# Altium footprint library Connector_art.PcbLib: 209 footprints (part 3 of 14)
Each footprint in its own frame and in the unit in brackets; x right, y up, seen from the top. Pads: shape width x height; smd on the part's side, far side on the other; paste and mask are expansions set on the pad; w line width, h text height; cw(c..) or ccw(c..) is an arc to the next point about the centre after c.
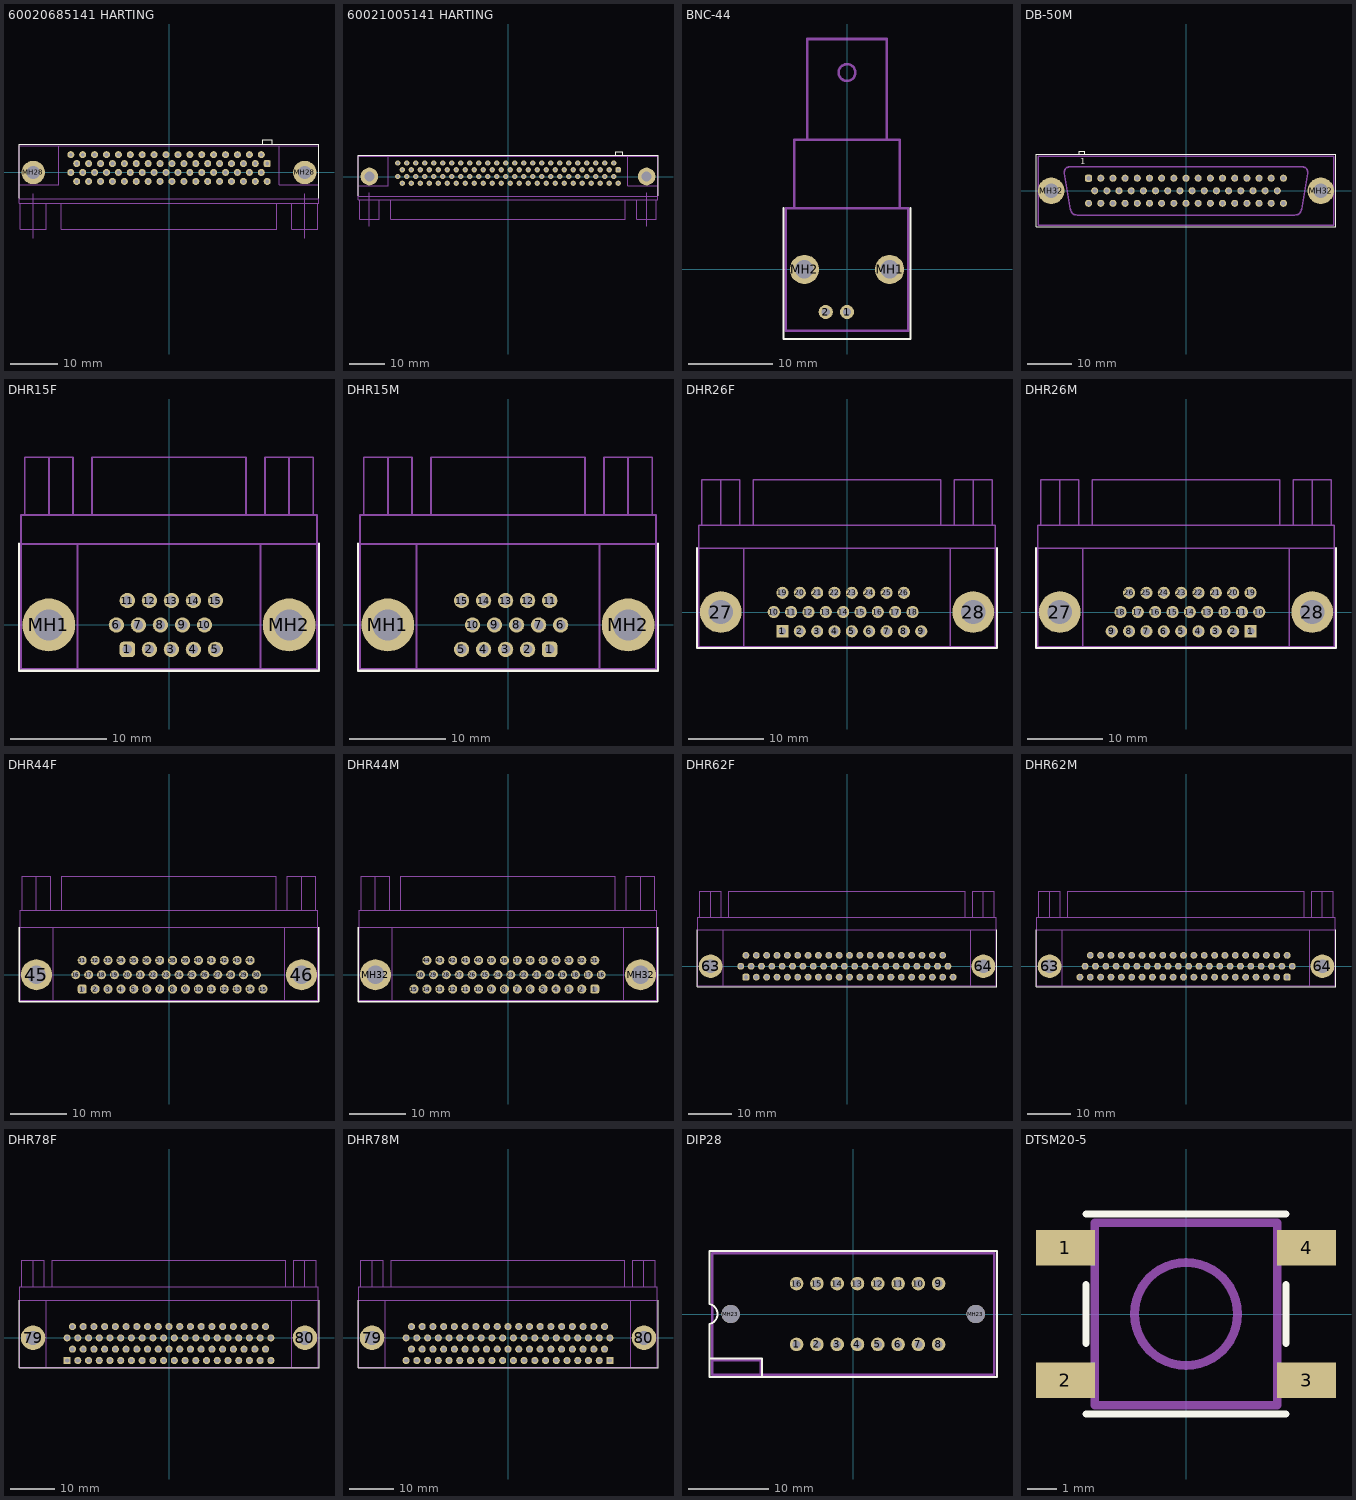
[diagram p2: the footprints below, top view; thin cyan lines are the x and y axes]

## 60020685141 HARTING [mm]
pads (70):
  rrect50% 1.5x1.5 hole 0.8: 1(20.955,1.9)
  round 1.5 hole 0.8: 2(19.685,3.8) 3(18.415,1.9) 4(17.145,3.8) 5(15.875,1.9) 6(14.605,3.8) 7(13.335,1.9) 8(12.065,3.8) 9(10.795,1.9) 10(9.525,3.8) 11(8.255,1.9) 12(6.985,3.8) 13(5.715,1.9) 14(4.445,3.8) 15(3.175,1.9) 16(1.905,3.8) 17(0.635,1.9) 18(-0.635,3.8) 19(-1.905,1.9) 20(-3.175,3.8) 21(-4.445,1.9) 22(-5.715,3.8) 23(-6.985,1.9) 24(-8.255,3.8) 25(-9.525,1.9) 26(-10.795,3.8) 27(-12.065,1.9) 28(-13.335,3.8) 29(-14.605,1.9) 30(-15.875,3.8) 31(-17.145,1.9) 32(-18.415,3.8) 33(-19.685,1.9) 34(-20.955,3.8) 35(20.955,-1.9) 36(19.685,0) 37(18.415,-1.9) 38(17.145,0) 39(15.875,-1.9) 40(14.605,0) 41(13.335,-1.9) 42(12.065,0) 43(10.795,-1.9) 44(9.525,0) 45(8.255,-1.9) 46(6.985,0) 47(5.715,-1.9) 48(4.445,0) 49(3.175,-1.9) 50(1.905,0) 51(0.635,-1.9) 52(-0.635,0) 53(-1.905,-1.9) 54(-3.175,0) 55(-4.445,-1.9) 56(-5.715,0) 57(-6.985,-1.9) 58(-8.255,0) 59(-9.525,-1.9) 60(-10.795,0) 61(-12.065,-1.9) 62(-13.335,0) 63(-14.605,-1.9) 64(-15.875,0) 65(-17.145,-1.9) 66(-18.415,0) 67(-19.685,-1.9) 68(-20.955,0)
  round 5 hole 2.8: MH28(-28.95,0) MH28(28.95,0)
Top Overlay:
  lines w0.25: -32,-5.5 -32,6 32,6 32,-5.5 ; 20,6 20,7 22,7 22,6
Mechanical 1:
  lines w0.1: -28.95,-14.05 -28.95,-4.55 ; 28.95,-14.05 28.95,-4.55
  lines w0.2: -31.9,-5.6 31.9,-5.6 ; -31.9,-2.6 -23.5,-2.6 -23.5,5.7 ; -31.7,-6.6 -31.7,-12.1 -26.2,-12.1 -26.2,-6.6 ; -23,-6.6 -23,-12.1 23,-12.1 23,-6.6 ; 23.5,5.7 23.5,-2.6 31.9,-2.6 ; 26.2,-6.6 26.2,-12.1 31.7,-12.1 31.7,-6.6 ; -31.9,-6.6 -31.9,5.7 31.9,5.7 31.9,-6.6 -31.9,-6.6
3D body: height 9.62, standoff -3.4, extent -31.94,-12.11 31.94,5.69

## 60021005141 HARTING [mm] "Female"
height 8.7
pads (102):
  rrect50% 1.5x1.5 hole 0.8: 1(31.115,1.9)
  round 1.5 hole 0.8: 2(29.845,3.8) 3(28.575,1.9) 4(27.305,3.8) 5(26.035,1.9) 6(24.765,3.8) 7(23.495,1.9) 8(22.225,3.8) 9(20.955,1.9) 10(19.685,3.8) 11(18.415,1.9) 12(17.145,3.8) 13(15.875,1.9) 14(14.605,3.8) 15(13.335,1.9) 16(12.065,3.8) 17(10.795,1.9) 18(9.525,3.8) 19(8.255,1.9) 20(6.985,3.8) 21(5.715,1.9) 22(4.445,3.8) 23(3.175,1.9) 24(1.905,3.8) 25(0.635,1.9) 26(-0.635,3.8) 27(-1.905,1.9) 28(-3.175,3.8) 29(-4.445,1.9) 30(-5.715,3.8) 31(-6.985,1.9) 32(-8.255,3.8) 33(-9.525,1.9) 34(-10.795,3.8) 35(-12.065,1.9) 36(-13.335,3.8) 37(-14.605,1.9) 38(-15.875,3.8) 39(-17.145,1.9) 40(-18.415,3.8) 41(-19.685,1.9) 42(-20.955,3.8) 43(-22.225,1.9) 44(-23.495,3.8) 45(-24.765,1.9) 46(-26.035,3.8) 47(-27.305,1.9) 48(-28.575,3.8) 49(-29.845,1.9) 50(-31.115,3.8) 51(31.115,-1.9) 52(29.845,0) 53(28.575,-1.9) 54(27.305,0) 55(26.035,-1.9) 56(24.765,0) 57(23.495,-1.9) 58(22.225,0) 59(20.955,-1.9) 60(19.685,0) 61(18.415,-1.9) 62(17.145,0) 63(15.875,-1.9) 64(14.605,0) 65(13.335,-1.9) 66(12.065,0) 67(10.795,-1.9) 68(9.525,0) 69(8.255,-1.9) 70(6.985,0) 71(5.715,-1.9) 72(4.445,0) 73(3.175,-1.9) 74(1.905,0) 75(0.635,-1.9) 76(-0.635,0) 77(-1.905,-1.9) 78(-3.175,0) 79(-4.445,-1.9) 80(-5.715,0) 81(-6.985,-1.9) 82(-8.255,0) 83(-9.525,-1.9) 84(-10.795,0) 85(-12.065,-1.9) 86(-13.335,0) 87(-14.605,-1.9) 88(-15.875,0) 89(-17.145,-1.9) 90(-18.415,0) 91(-19.685,-1.9) 92(-20.955,0) 93(-22.225,-1.9) 94(-23.495,0) 95(-24.765,-1.9) 96(-26.035,0) 97(-27.305,-1.9) 98(-28.575,0) 99(-29.845,-1.9) 100(-31.115,0)
  round 5 hole 2.8: MH28(-39.15,0) MH28(39.15,0)
Top Overlay:
  lines w0.25: -42.35,-5.5 -42.35,6 42.35,6 42.35,-5.5 ; 30.4,6 30.4,7 32.4,7 32.4,6
Mechanical 1:
  lines w0.1: -39.15,-14.05 -39.15,-4.55 ; 39.15,-14.05 39.15,-4.55
  lines w0.2: -42.25,-5.6 42.25,-5.6 ; -42.25,-2.6 -33.85,-2.6 -33.85,5.7 ; -41.9,-6.6 -41.9,-12.1 -36.4,-12.1 -36.4,-6.6 ; -33.1,-6.6 -33.1,-12.1 33.1,-12.1 33.1,-6.6 ; 33.85,5.7 33.85,-2.6 42.25,-2.6 ; 36.4,-6.6 36.4,-12.1 41.9,-12.1 41.9,-6.6 ; -42.25,-6.6 -42.25,5.7 42.25,5.7 42.25,-6.6 -42.25,-6.6
3D body: height 9.62, standoff -3.4, extent -42.1,-12.11 42.1,5.69

## BNC-44 [mm]
height 13.16
pads (4):
  round 1.7 hole 1: 1(0,-5.08) 2(-2.54,-5.08)
  round 3.5 hole 2.2: MH1(5.08,0) MH2(-5.08,0)
Top Overlay:
  lines w0.25: -7.6,7.3 -7.6,-8.3 7.6,-8.3 7.6,7.3
Mechanical 1:
  circle w0.3: c0,23.5 r1
  lines w0.3: -6.3,7.3 -6.3,15.5 6.3,15.5 6.3,7.3 ; -4.75,15.5 -4.75,27.5 4.75,27.5 4.75,15.5 ; -7.3,-7.3 7.3,-7.3 7.3,7.3 -7.3,7.3 -7.3,-7.3
3D body: height 13.16, standoff -3.7, extent -7.35,-8.1 7.35,27.5

## DB-50M [mm]
pads (52):
  rrect50% 1.6x1.6 hole 1: 1(-22.08,2.84)
  round 1.6 hole 1: 2(-19.32,2.84) 3(-16.56,2.84) 4(-13.8,2.84) 5(-11.04,2.84) 6(-8.28,2.84) 7(-5.52,2.84) 8(-2.76,2.84) 9(0,2.84) 10(2.76,2.84) 11(5.52,2.84) 12(8.28,2.84) 13(11.04,2.84) 14(13.8,2.84) 15(16.56,2.84) 16(19.32,2.84) 17(22.08,2.84) 18(-20.7,0) 19(-17.94,0) 20(-15.18,0) 21(-12.42,0) 22(-9.66,0) 23(-6.9,0) 24(-4.14,0) 25(-1.38,0) 26(1.38,0) 27(4.14,0) 28(6.9,0) 29(9.66,0) 30(12.42,0) 31(15.18,0) 32(17.94,0) 33(20.7,0) 34(-22.08,-2.84) 35(-19.32,-2.84) 36(-16.56,-2.84) 37(-13.8,-2.84) 38(-11.04,-2.84) 39(-8.28,-2.84) 40(-5.52,-2.84) 41(-2.76,-2.84) 42(0,-2.84) 43(2.76,-2.84) 44(5.52,-2.84) 45(8.28,-2.84) 46(11.04,-2.84) 47(13.8,-2.84) 48(16.56,-2.84) 49(19.32,-2.84) 50(22.08,-2.84)
  round 6 hole 3.2: MH32(-30.55,0) MH32(30.55,0)
Top Overlay:
  lines w0.25: -24.25,8.3 -24.25,9 -23,9 -23,8.3 ; -34,-8.2 34,-8.2 34,8.3 -34,8.3 -34,-8.2
  text "1" at -24,6 h1.38
Mechanical 1:
  circle w0.3: c-22.08,-2.84 r0.5
  circle w0.3: c-22.08,2.84 r0.5
  circle w0.3: c-19.32,-2.84 r0.5
  circle w0.3: c-19.32,2.84 r0.5
  circle w0.3: c-16.56,-2.84 r0.5
  circle w0.3: c-16.56,2.84 r0.5
  circle w0.3: c-13.8,-2.84 r0.5
  circle w0.3: c-13.8,2.84 r0.5
  circle w0.3: c-11.04,-2.84 r0.5
  circle w0.3: c-11.04,2.84 r0.5
  circle w0.3: c-8.28,-2.84 r0.5
  circle w0.3: c-8.28,2.84 r0.5
  circle w0.3: c-5.52,-2.84 r0.5
  circle w0.3: c-5.52,2.84 r0.5
  circle w0.3: c-2.76,-2.84 r0.5
  circle w0.3: c-2.76,2.84 r0.5
  circle w0.3: c22.08,-2.84 r0.5
  circle w0.3: c22.08,2.84 r0.5
  circle w0.3: c19.32,-2.84 r0.5
  circle w0.3: c19.32,2.84 r0.5
  circle w0.3: c16.56,-2.84 r0.5
  circle w0.3: c16.56,2.84 r0.5
  circle w0.3: c13.8,-2.84 r0.5
  circle w0.3: c13.8,2.84 r0.5
  circle w0.3: c11.04,-2.84 r0.5
  circle w0.3: c11.04,2.84 r0.5
  circle w0.3: c8.28,-2.84 r0.5
  circle w0.3: c8.28,2.84 r0.5
  circle w0.3: c5.52,-2.84 r0.5
  circle w0.3: c5.52,2.84 r0.5
  circle w0.3: c2.76,-2.84 r0.5
  circle w0.3: c2.76,2.84 r0.5
  circle w0.3: c-20.7,0 r0.5
  circle w0.3: c-17.94,0 r0.5
  circle w0.3: c-15.18,0 r0.5
  circle w0.3: c-12.42,0 r0.5
  circle w0.3: c-9.66,0 r0.5
  circle w0.3: c-6.9,0 r0.5
  circle w0.3: c-4.14,0 r0.5
  circle w0.3: c20.7,0 r0.5
  circle w0.3: c17.94,0 r0.5
  circle w0.3: c15.18,0 r0.5
  circle w0.3: c12.42,0 r0.5
  circle w0.3: c9.66,0 r0.5
  circle w0.3: c6.9,0 r0.5
  circle w0.3: c4.14,0 r0.5
  circle w0.3: c0,2.84 r0.5
  circle w0.3: c1.38,0 r0.5
  circle w0.3: c-1.38,0 r0.5
  circle w0.3: c0,-2.84 r0.5
  circle w0.3: c-30.55,0 r1.5
  circle w0.3: c30.55,0 r1.5
  lines w0.1: -33.05,0 -28.05,0 ; -30.55,-2.5 -30.55,2.5 ; 28.05,0 33.05,0 ; 30.55,-2.5 30.55,2.5
  lines w0.3: -26.2,-4.2 -27.65,4 cw(c-26.15,4) -26.15,5.5 ; -26.2,5.5 26.2,5.5 ; -26.193,-4.149 ccw(c-24.7,-4) -24.7,-5.5 24.7,-5.5 ccw(c24.7,-4) 26.193,-4.149 ; 26.15,5.5 cw(c26.15,4) 27.65,4 26.2,-4.2 ; -33.5,-7.8 33.5,-7.8 33.5,7.8 -33.5,7.8 -33.5,-7.8
  text "18" at -23.89,-0.5 h2.12
  text "33" at 22.36,-0.75 h2.12
  text "34" at -25.39,-3.5 h2.12
  text "50" at 23.86,-3.5 h2.12
  text "1" at -25.39,2.25 h2.12
  text "17" at 23.61,2.25 h2.12

## DHR15F [mm]
pads (17):
  rrect50% 1.6x1.6 hole 1: 1(-4.33,-2.54)
  round 1.6 hole 1: 2(-2.04,-2.54) 3(0.25,-2.54) 4(2.54,-2.54) 5(4.83,-2.54) 6(-5.47,0) 7(-3.18,0) 8(-0.89,0) 9(1.4,0) 10(3.69,0) 11(-4.33,2.54) 12(-2.04,2.54) 13(0.25,2.54) 14(2.54,2.54) 15(4.83,2.54)
  round 5.5 hole 3.2: MH1(-12.5,0) MH2(12.5,0)
Top Overlay:
  lines w0.25: -15.6,8.44 -15.6,-4.76 15.6,-4.76 15.6,-4.56 15.6,8.44
Mechanical 1:
  lines w0.2: -15.4,8.44 15.4,8.44 ; -15,11.44 -15,17.44 -10,17.44 -10,11.44 ; -12.5,11.44 -12.5,17.44 ; -9.5,-4.56 -9.5,8.44 ; -8,11.44 -8,17.44 8,17.44 8,11.44 ; 9.5,-4.56 9.5,8.44 ; 10,11.44 10,17.44 15,17.44 15,11.44 ; 12.5,11.44 12.5,17.44 ; -15.4,-4.56 -15.4,11.44 15.4,11.44 15.4,-4.56 -15.4,-4.56
  text "11" at -7.424,1.343 h2.12
  text "6" at -7.528,-1.157 h2.12
  text "10" at 5.076,-1.157 h2.12
  text "1" at -6.528,-3.657 h2.12
  text "15" at 6.076,1.343 h2.12
  text "5" at 6.472,-3.657 h2.12
3D body: height 12.55, standoff -3.8, extent -15.45,-3.97 15.45,17.63

## DHR15M [mm]
pads (17):
  rrect50% 1.6x1.6 hole 1: 1(4.33,-2.54)
  round 1.6 hole 1: 2(2.04,-2.54) 3(-0.25,-2.54) 4(-2.54,-2.54) 5(-4.83,-2.54) 6(5.47,0) 7(3.18,0) 8(0.89,0) 9(-1.4,0) 10(-3.69,0) 11(4.33,2.54) 12(2.04,2.54) 13(-0.25,2.54) 14(-2.54,2.54) 15(-4.83,2.54)
  round 5.5 hole 3.2: MH1(-12.5,0) MH2(12.5,0)
Top Overlay:
  lines w0.25: -15.6,8.44 -15.6,-4.76 15.6,-4.76 15.6,-4.56 15.6,8.44
Mechanical 1:
  lines w0.2: -15.4,8.44 15.4,8.44 ; -15,11.44 -15,17.44 -10,17.44 -10,11.44 ; -12.5,11.44 -12.5,17.44 ; -9.5,-4.56 -9.5,8.44 ; -8,11.44 -8,17.44 8,17.44 8,11.44 ; 9.5,-4.56 9.5,8.44 ; 10,11.44 10,17.44 15,17.44 15,11.44 ; 12.5,11.44 12.5,17.44 ; -15.4,-4.56 -15.4,11.44 15.4,11.44 15.4,-4.56 -15.4,-4.56
  text "11" at 5.226,1.283 h2.12
  text "1" at 5.622,-3.797 h2.12
  text "10" at -7.924,-1.157 h2.12
  text "15" at -8.744,1.283 h2.12
  text "6" at 6.892,-1.257 h2.12
  text "5" at -8.348,-3.797 h2.12
3D body: height 12.5, standoff -3.5, extent -15.405,-4.87 15.405,17.43

## DHR26F [mm]
pads (28):
  rect 1.6x1.6 hole 1: 1(-8.52,-2.54)
  round 1.6 hole 1: 2(-6.23,-2.54) 3(-3.94,-2.54) 4(-1.65,-2.54) 5(0.64,-2.54) 6(2.93,-2.54) 7(5.22,-2.54) 8(7.51,-2.54) 9(9.8,-2.54) 10(-9.67,0) 11(-7.38,0) 12(-5.09,0) 13(-2.8,0) 14(-0.51,0) 15(1.78,0) 16(4.07,0) 17(6.36,0) 18(8.65,0) 19(-8.52,2.54) 20(-6.23,2.54) 21(-3.94,2.54) 22(-1.65,2.54) 23(0.64,2.54) 24(2.93,2.54) 25(5.22,2.54) 26(7.51,2.54)
  round 5.5 hole 3.2: 27(-16.65,0) 28(16.65,0)
Top Overlay:
  lines w0.25: -19.8,8.44 -19.8,-4.76 19.8,-4.76 19.8,8.44
Mechanical 1:
  lines w0.2: -19.6,8.44 19.6,8.44 ; -19.15,11.44 -19.15,17.44 -14.15,17.44 -14.15,11.44 ; -16.65,11.44 -16.65,17.44 ; -13.65,-4.56 -13.65,8.44 ; -12.35,11.44 -12.35,17.44 12.35,17.44 12.35,11.44 ; 13.65,-4.56 13.65,8.44 ; 14.15,11.44 14.15,17.44 19.15,17.44 19.15,11.44 ; 16.65,11.44 16.65,17.44 ; -19.6,-4.56 19.6,-4.56 19.6,11.44 -19.6,11.44 -19.6,-4.56
  text "9" at 11.272,-3.717 h2.12
  text "1" at -11.728,-3.717 h2.12
  text "26" at 8.876,1.283 h2.12
  text "18" at 10.376,-1.217 h2.12
  text "19" at -12.124,1.283 h2.12
  text "10" at -13.124,-1.217 h2.12

## DHR26M [mm]
pads (28):
  rect 1.6x1.6 hole 1: 1(8.52,-2.54)
  round 1.6 hole 1: 2(6.23,-2.54) 3(3.94,-2.54) 4(1.65,-2.54) 5(-0.64,-2.54) 6(-2.93,-2.54) 7(-5.22,-2.54) 8(-7.51,-2.54) 9(-9.8,-2.54) 10(9.67,0) 11(7.38,0) 12(5.09,0) 13(2.8,0) 14(0.51,0) 15(-1.78,0) 16(-4.07,0) 17(-6.36,0) 18(-8.65,0) 19(8.52,2.54) 20(6.23,2.54) 21(3.94,2.54) 22(1.65,2.54) 23(-0.64,2.54) 24(-2.93,2.54) 25(-5.22,2.54) 26(-7.51,2.54)
  round 5.5 hole 3.2: 27(-16.65,0) 28(16.65,0)
Top Overlay:
  lines w0.25: -19.8,8.44 -19.8,-4.76 19.8,-4.76 19.8,8.44
Mechanical 1:
  lines w0.2: -19.6,8.44 19.6,8.44 ; -19.15,11.44 -19.15,17.44 -14.15,17.44 -14.15,11.44 ; -16.65,11.44 -16.65,17.44 ; -13.65,-4.56 -13.65,8.44 ; -12.35,11.44 -12.35,17.44 12.35,17.44 12.35,11.44 ; 13.65,-4.56 13.65,8.44 ; 14.15,11.44 14.15,17.44 19.15,17.44 19.15,11.44 ; 16.65,11.44 16.65,17.44 ; -19.6,-4.56 -19.6,11.44 19.6,11.44 19.6,-4.56 -19.6,-4.56
  text "26" at -11.284,1.283 h2.12
  text "18" at -12.554,-1.257 h2.12
  text "10" at 10.376,-1.217 h2.12
  text "19" at 10.306,1.283 h2.12
  text "9" at -12.158,-3.797 h2.12
  text "1" at 9.432,-3.797 h2.12

## DHR44F [mm]
pads (46):
  rrect50% 1.6x1.6 hole 1: 1(-15.39,-2.54)
  round 1.6 hole 1: 2(-13.1,-2.54) 3(-10.81,-2.54) 4(-8.52,-2.54) 5(-6.23,-2.54) 6(-3.94,-2.54) 7(-1.65,-2.54) 8(0.64,-2.54) 9(2.93,-2.54) 10(5.22,-2.54) 11(7.51,-2.54) 12(9.8,-2.54) 13(12.09,-2.54) 14(14.38,-2.54) 15(16.67,-2.54) 16(-16.54,0) 17(-14.25,0) 18(-11.96,0) 19(-9.67,0) 20(-7.38,0) 21(-5.09,0) 22(-2.8,0) 23(-0.51,0) 24(1.78,0) 25(4.07,0) 26(6.36,0) 27(8.65,0) 28(10.94,0) 29(13.23,0) 30(15.52,0) 31(-15.39,2.54) 32(-13.1,2.54) 33(-10.81,2.54) 34(-8.52,2.54) 35(-6.23,2.54) 36(-3.94,2.54) 37(-1.65,2.54) 38(0.64,2.54) 39(2.93,2.54) 40(5.22,2.54) 41(7.51,2.54) 42(9.8,2.54) 43(12.09,2.54) 44(14.38,2.54)
  round 5.5 hole 3.2: 45(-23.5,0) 46(23.5,0)
Top Overlay:
  lines w0.25: -26.6,8.44 -26.6,-4.76 26.6,-4.76 26.6,-4.56 26.6,8.44
Mechanical 1:
  lines w0.2: -26.4,8.44 26.4,8.44 ; -26,11.44 -26,17.44 -21,17.44 -21,11.44 ; -23.5,11.44 -23.5,17.44 ; -20.5,-4.56 -20.5,8.44 ; -19,11.44 -19,17.44 19,17.44 19,11.44 ; 20.5,-4.56 20.5,8.44 ; 21,11.44 21,17.44 26,17.44 26,11.44 ; 23.5,11.44 23.5,17.44 ; -26.4,-4.56 -26.4,11.44 26.4,11.44 26.4,-4.56 -26.4,-4.56
  text "31" at -19.224,1.283 h2.12
  text "16" at -20.224,-1.217 h2.12
  text "44" at 15.276,1.283 h2.12
  text "30" at 16.776,-1.217 h2.12
  text "1" at -18.828,-3.717 h2.12
  text "15" at 17.276,-3.717 h2.12
3D body: height 12.55, standoff -4.27, extent -26.525,-3.63 26.525,17.43

## DHR44M [mm]
pads (46):
  rrect50% 1.6x1.6 hole 1: 1(15.39,-2.54)
  round 1.6 hole 1: 2(13.1,-2.54) 3(10.81,-2.54) 4(8.52,-2.54) 5(6.23,-2.54) 6(3.94,-2.54) 7(1.65,-2.54) 8(-0.64,-2.54) 9(-2.93,-2.54) 10(-5.22,-2.54) 11(-7.51,-2.54) 12(-9.8,-2.54) 13(-12.09,-2.54) 14(-14.38,-2.54) 15(-16.67,-2.54) 16(16.54,0) 17(14.25,0) 18(11.96,0) 19(9.67,0) 20(7.38,0) 21(5.09,0) 22(2.8,0) 23(0.51,0) 24(-1.78,0) 25(-4.07,0) 26(-6.36,0) 27(-8.65,0) 28(-10.94,0) 29(-13.23,0) 30(-15.52,0) 31(15.39,2.54) 32(13.1,2.54) 33(10.81,2.54) 34(8.52,2.54) 35(6.23,2.54) 36(3.94,2.54) 37(1.65,2.54) 38(-0.64,2.54) 39(-2.93,2.54) 40(-5.22,2.54) 41(-7.51,2.54) 42(-9.8,2.54) 43(-12.09,2.54) 44(-14.38,2.54)
  round 5.5 hole 3.2: MH32(-23.5,0) MH32(23.5,0)
Top Overlay:
  lines w0.25: -26.6,8.44 -26.6,-4.76 26.6,-4.76 26.6,-4.56 26.6,8.44
Mechanical 1:
  lines w0.2: -26.4,8.44 26.4,8.44 ; -26,11.44 -26,17.44 -21,17.44 -21,11.44 ; -23.5,11.44 -23.5,17.44 ; -20.5,-4.56 -20.5,8.44 ; -19,11.44 -19,17.44 19,17.44 19,11.44 ; 20.5,-4.56 20.5,8.44 ; 21,11.44 21,17.44 26,17.44 26,11.44 ; 23.5,11.44 23.5,17.44 ; -26.4,-4.56 -26.4,11.44 26.4,11.44 26.4,-4.56 -26.4,-4.56
  text "30" at -18.904,-1.257 h2.12
  text "44" at -17.634,1.283 h2.12
  text "16" at 17.926,-1.257 h2.12
  text "31" at 16.656,1.283 h2.12
  text "15" at -20.174,-3.797 h2.12
  text "1" at 17.052,-3.797 h2.12
3D body: height 12.55, standoff -4.1, extent -26.525,-3.63 26.525,17.43

## DHR62F [mm]
pads (64):
  rrect50% 1.6x1.6 hole 1: 1(-23.52,-2.54)
  round 1.6 hole 1: 2(-21.11,-2.54) 3(-18.7,-2.54) 4(-16.29,-2.54) 5(-13.88,-2.54) 6(-11.47,-2.54) 7(-9.06,-2.54) 8(-6.65,-2.54) 9(-4.24,-2.54) 10(-1.83,-2.54) 11(0.58,-2.54) 12(2.99,-2.54) 13(5.4,-2.54) 14(7.81,-2.54) 15(10.22,-2.54) 16(12.63,-2.54) 17(15.04,-2.54) 18(17.45,-2.54) 19(19.86,-2.54) 20(22.27,-2.54) 21(24.68,-2.54) 22(-24.72,0) 23(-22.31,0) 24(-19.9,0) 25(-17.49,0) 26(-15.08,0) 27(-12.67,0) 28(-10.26,0) 29(-7.85,0) 30(-5.44,0) 31(-3.03,0) 32(-0.62,0) 33(1.79,0) 34(4.2,0) 35(6.61,0) 36(9.02,0) 37(11.43,0) 38(13.84,0) 39(16.25,0) 40(18.66,0) 41(21.07,0) 42(23.48,0) 43(-23.52,2.54) 44(-21.11,2.54) 45(-18.7,2.54) 46(-16.29,2.54) 47(-13.88,2.54) 48(-11.47,2.54) 49(-9.06,2.54) 50(-6.65,2.54) 51(-4.24,2.54) 52(-1.83,2.54) 53(0.58,2.54) 54(2.99,2.54) 55(5.4,2.54) 56(7.81,2.54) 57(10.22,2.54) 58(12.63,2.54) 59(15.04,2.54) 60(17.45,2.54) 61(19.86,2.54) 62(22.27,2.54)
  round 5.5 hole 3.2: 63(-31.75,0) 64(31.75,0)
Top Overlay:
  lines w0.25: -34.9,8.44 -34.9,-4.76 34.9,-4.76 34.9,8.44
Mechanical 1:
  lines w0.2: -34.7,8.44 34.7,8.44 ; -34.25,11.44 -34.25,17.44 -29.25,17.44 -29.25,11.44 ; -31.75,11.44 -31.75,17.44 ; -28.8,-4.56 -28.8,8.44 ; -27.5,11.44 -27.5,17.44 27.5,17.44 27.5,11.44 ; 28.8,-4.56 28.8,8.44 ; 29.25,11.44 29.25,17.44 34.25,17.44 34.25,11.44 ; 31.75,11.44 31.75,17.44 ; -34.7,-4.56 -34.7,11.44 34.7,11.44 34.7,-4.56 -34.7,-4.56
  text "22" at -27.844,-1.217 h2.12
  text "43" at -26.844,1.283 h2.12
  text "62" at 22.896,1.283 h2.12
  text "42" at 24.396,-1.217 h2.12
  text "1" at -26.448,-3.717 h2.12
  text "21" at 24.896,-3.717 h2.12
3D body: height 12.5, standoff -4, extent -34.7,-4.87 34.7,17.43

## DHR62M [mm]
pads (64):
  rrect50% 1.6x1.6 hole 1: 1(23.52,-2.54)
  round 1.6 hole 1: 2(21.11,-2.54) 3(18.7,-2.54) 4(16.29,-2.54) 5(13.88,-2.54) 6(11.47,-2.54) 7(9.06,-2.54) 8(6.65,-2.54) 9(4.24,-2.54) 10(1.83,-2.54) 11(-0.58,-2.54) 12(-2.99,-2.54) 13(-5.4,-2.54) 14(-7.81,-2.54) 15(-10.22,-2.54) 16(-12.63,-2.54) 17(-15.04,-2.54) 18(-17.45,-2.54) 19(-19.86,-2.54) 20(-22.27,-2.54) 21(-24.68,-2.54) 22(24.72,0) 23(22.31,0) 24(19.9,0) 25(17.49,0) 26(15.08,0) 27(12.67,0) 28(10.26,0) 29(7.85,0) 30(5.44,0) 31(3.03,0) 32(0.62,0) 33(-1.79,0) 34(-4.2,0) 35(-6.61,0) 36(-9.02,0) 37(-11.43,0) 38(-13.84,0) 39(-16.25,0) 40(-18.66,0) 41(-21.07,0) 42(-23.48,0) 43(23.52,2.54) 44(21.11,2.54) 45(18.7,2.54) 46(16.29,2.54) 47(13.88,2.54) 48(11.47,2.54) 49(9.06,2.54) 50(6.65,2.54) 51(4.24,2.54) 52(1.83,2.54) 53(-0.58,2.54) 54(-2.99,2.54) 55(-5.4,2.54) 56(-7.81,2.54) 57(-10.22,2.54) 58(-12.63,2.54) 59(-15.04,2.54) 60(-17.45,2.54) 61(-19.86,2.54) 62(-22.27,2.54)
  round 5.5 hole 3.2: 63(-31.75,0) 64(31.75,0)
Top Overlay:
  lines w0.25: -34.9,8.44 -34.9,-4.76 34.9,-4.76 34.9,8.44
Mechanical 1:
  lines w0.2: -34.7,8.44 34.7,8.44 ; -34.25,11.44 -34.25,17.44 -29.25,17.44 -29.25,11.44 ; -31.75,11.44 -31.75,17.44 ; -28.8,-4.56 -28.8,8.44 ; -27.5,11.44 -27.5,17.44 27.5,17.44 27.5,11.44 ; 28.8,-4.56 28.8,8.44 ; 29.25,11.44 29.25,17.44 34.25,17.44 34.25,11.44 ; 31.75,11.44 31.75,17.44 ; -34.7,-4.56 34.7,-4.56 34.7,11.44 -34.7,11.44 -34.7,-4.56
  text "1" at 24.672,-3.797 h2.12
  text "21" at -27.794,-3.797 h2.12
  text "43" at 24.276,1.283 h2.12
  text "22" at 25.546,-1.257 h2.12
  text "62" at -25.254,1.283 h2.12
  text "42" at -26.524,-1.257 h2.12

## DHR78F [mm]
pads (80):
  rect 1.6x1.6 hole 1: 1(-22.9,-5.08)
  round 1.6 hole 1: 2(-20.49,-5.08) 3(-18.08,-5.08) 4(-15.67,-5.08) 5(-13.26,-5.08) 6(-10.85,-5.08) 7(-8.44,-5.08) 8(-6.03,-5.08) 9(-3.62,-5.08) 10(-1.21,-5.08) 11(1.2,-5.08) 12(3.61,-5.08) 13(6.02,-5.08) 14(8.43,-5.08) 15(10.84,-5.08) 16(13.25,-5.08) 17(15.66,-5.08) 18(18.07,-5.08) 19(20.48,-5.08) 20(22.89,-5.08) 21(-21.69,-2.54) 22(-19.28,-2.54) 23(-16.87,-2.54) 24(-14.46,-2.54) 25(-12.05,-2.54) 26(-9.64,-2.54) 27(-7.23,-2.54) 28(-4.82,-2.54) 29(-2.41,-2.54) 30(0,-2.54) 31(2.41,-2.54) 32(4.82,-2.54) 33(7.23,-2.54) 34(9.64,-2.54) 35(12.05,-2.54) 36(14.46,-2.54) 37(16.87,-2.54) 38(19.28,-2.54) 39(21.69,-2.54) 40(-22.9,0) 41(-20.49,0) 42(-18.08,0) 43(-15.67,0) 44(-13.26,0) 45(-10.85,0) 46(-8.44,0) 47(-6.03,0) 48(-3.62,0) 49(-1.21,0) 50(1.2,0) 51(3.61,0) 52(6.02,0) 53(8.43,0) 54(10.84,0) 55(13.25,0) 56(15.66,0) 57(18.07,0) 58(20.48,0) 59(22.89,0) 60(-21.69,2.54) 61(-19.28,2.54) 62(-16.87,2.54) 63(-14.46,2.54) 64(-12.05,2.54) 65(-9.64,2.54) 66(-7.23,2.54) 67(-4.82,2.54) 68(-2.41,2.54) 69(0,2.54) 70(2.41,2.54) 71(4.82,2.54) 72(7.23,2.54) 73(9.64,2.54) 74(12.05,2.54) 75(14.46,2.54) 76(16.87,2.54) 77(19.28,2.54) 78(21.69,2.54)
  round 5.5 hole 3.2: 79(-30.55,0) 80(30.55,0)
Top Overlay:
  lines w0.25: -33.7,8.44 -33.7,-6.71 33.7,-6.71 33.7,8.44
Mechanical 1:
  lines w0.2: -33.5,8.44 33.5,8.44 ; -33.05,11.44 -33.05,17.44 -28.05,17.44 -28.05,11.44 ; -30.55,11.44 -30.55,17.44 ; -27.6,-6.56 -27.6,8.44 ; -26.25,11.44 -26.25,17.44 26.25,17.44 26.25,11.44 ; 27.6,-6.56 27.6,8.44 ; 28.05,11.44 28.05,17.44 33.05,17.44 33.05,11.44 ; 30.55,11.44 30.55,17.44 ; -33.5,-6.56 33.5,-6.56 33.5,11.44 -33.5,11.44 -33.5,-6.56
  text "78" at 23.006,1.283 h2.12
  text "20" at 24.276,-6.337 h2.12
  text "60" at -25.254,1.283 h2.12
  text "1" at -26.128,-6.337 h2.12
  text "39" at 23.006,-3.797 h2.12
  text "59" at 24.276,-1.257 h2.12
  text "21" at -25.254,-3.797 h2.12
  text "40" at -26.524,-1.257 h2.12

## DHR78M [mm]
pads (80):
  rect 1.6x1.6 hole 1: 1(22.9,-5.08)
  round 1.6 hole 1: 2(20.49,-5.08) 3(18.08,-5.08) 4(15.67,-5.08) 5(13.26,-5.08) 6(10.85,-5.08) 7(8.44,-5.08) 8(6.03,-5.08) 9(3.62,-5.08) 10(1.21,-5.08) 11(-1.2,-5.08) 12(-3.61,-5.08) 13(-6.02,-5.08) 14(-8.43,-5.08) 15(-10.84,-5.08) 16(-13.25,-5.08) 17(-15.66,-5.08) 18(-18.07,-5.08) 19(-20.48,-5.08) 20(-22.89,-5.08) 21(21.69,-2.54) 22(19.28,-2.54) 23(16.87,-2.54) 24(14.46,-2.54) 25(12.05,-2.54) 26(9.64,-2.54) 27(7.23,-2.54) 28(4.82,-2.54) 29(2.41,-2.54) 30(0,-2.54) 31(-2.41,-2.54) 32(-4.82,-2.54) 33(-7.23,-2.54) 34(-9.64,-2.54) 35(-12.05,-2.54) 36(-14.46,-2.54) 37(-16.87,-2.54) 38(-19.28,-2.54) 39(-21.69,-2.54) 40(22.9,0) 41(20.49,0) 42(18.08,0) 43(15.67,0) 44(13.26,0) 45(10.85,0) 46(8.44,0) 47(6.03,0) 48(3.62,0) 49(1.21,0) 50(-1.2,0) 51(-3.61,0) 52(-6.02,0) 53(-8.43,0) 54(-10.84,0) 55(-13.25,0) 56(-15.66,0) 57(-18.07,0) 58(-20.48,0) 59(-22.89,0) 60(21.69,2.54) 61(19.28,2.54) 62(16.87,2.54) 63(14.46,2.54) 64(12.05,2.54) 65(9.64,2.54) 66(7.23,2.54) 67(4.82,2.54) 68(2.41,2.54) 69(0,2.54) 70(-2.41,2.54) 71(-4.82,2.54) 72(-7.23,2.54) 73(-9.64,2.54) 74(-12.05,2.54) 75(-14.46,2.54) 76(-16.87,2.54) 77(-19.28,2.54) 78(-21.69,2.54)
  round 5.5 hole 3.2: 79(-30.55,0) 80(30.55,0)
Top Overlay:
  lines w0.25: -33.7,8.44 -33.7,-6.71 33.7,-6.71 33.7,8.44
Mechanical 1:
  lines w0.2: -33.5,8.44 33.5,8.44 ; -33.05,11.44 -33.05,17.44 -28.05,17.44 -28.05,11.44 ; -30.55,11.44 -30.55,17.44 ; -27.6,-6.56 -27.6,8.44 ; -26.25,11.44 -26.25,17.44 26.25,17.44 26.25,11.44 ; 27.6,-6.56 27.6,8.44 ; 28.05,11.44 28.05,17.44 33.05,17.44 33.05,11.44 ; 30.55,11.44 30.55,17.44 ; -33.5,-6.56 33.5,-6.56 33.5,11.44 -33.5,11.44 -33.5,-6.56
  text "60" at 23.006,1.283 h2.12
  text "1" at 24.672,-6.337 h2.12
  text "78" at -25.254,1.283 h2.12
  text "20" at -26.524,-6.337 h2.12
  text "40" at 24.276,-1.257 h2.12
  text "21" at 23.006,-3.797 h2.12
  text "59" at -26.524,-1.257 h2.12
  text "39" at -25.254,-3.797 h2.12

## DIP28 [mm]
height 4.5
pads (18):
  round 1.7 hole 1: 1(-7.09,-3.81) 2(-4.55,-3.81) 3(-2.01,-3.81) 4(0.53,-3.81) 5(3.07,-3.81) 6(5.61,-3.81) 7(8.15,-3.81) 8(10.69,-3.81) 9(10.69,3.81) 10(8.15,3.81) 11(5.61,3.81) 12(3.07,3.81) 13(0.53,3.81) 14(-2.01,3.81) 15(-4.55,3.81) 16(-7.09,3.81)
  round 2.3 hole 2.3 unplated: MH23(-15.35,0) MH23(15.35,0)
Top Overlay:
  lines w0.25: -18,-5.6 -11.4,-5.6 -11.4,-7.9 ; -18,-7.9 18,-7.9 18,7.9 -18,7.9 -18,1.25 cw(c-18.281,0) -18,-1.25 -18,-7.9
Mechanical 1:
  lines w0.3: -17.65,-5.8 -11.6,-5.8 -11.6,-7.6 ; -17.65,-7.6 17.65,-7.6 17.65,7.6 -17.65,7.6 -17.65,-7.6
3D body: height 24.8, standoff -2.7, extent -17.65,-9.035 17.65,7.5

## DTSM20-5 [mm]
height 5
pads (4):
  rect 2x1.2 smd: 1(-4.1,2.25) 2(-4.1,-2.25) 3(4.1,-2.25) 4(4.1,2.25)
Top Overlay:
  lines w0.25: -3.4,-3.4 3.4,-3.4 ; -3.4,-1 -3.4,1 ; -3.4,3.4 3.4,3.4 ; 3.4,-1 3.4,1
Mechanical 1:
  circle w0.3: c0,0 r1.75
  lines w0.3: -3.1,-2.6 -4.5,-2.6 -4.5,-1.9 -3.1,-1.9 ; -3.1,1.9 -4.5,1.9 -4.5,2.6 -3.1,2.6 ; 3.1,-2.6 4.5,-2.6 4.5,-1.9 3.1,-1.9 ; 3.1,1.9 4.5,1.9 4.5,2.6 3.1,2.6 ; -3.1,-3.1 -3.1,3.1 3.1,3.1 3.1,-3.1 -3.1,-3.1
3D body: height 5.1, standoff 0, extent -4.5,-3.1 4.5,3.1